# Altium footprint library tianxiaohua_PcbLib.PcbLib: 138 footprints (part 2 of 9)
Each footprint in its own frame and in the unit in brackets; x right, y up, seen from the top. Pads: shape width x height; smd on the part's side, far side on the other; paste and mask are expansions set on the pad; w line width, h text height; cw(c..) or ccw(c..) is an arc to the next point about the centre after c.
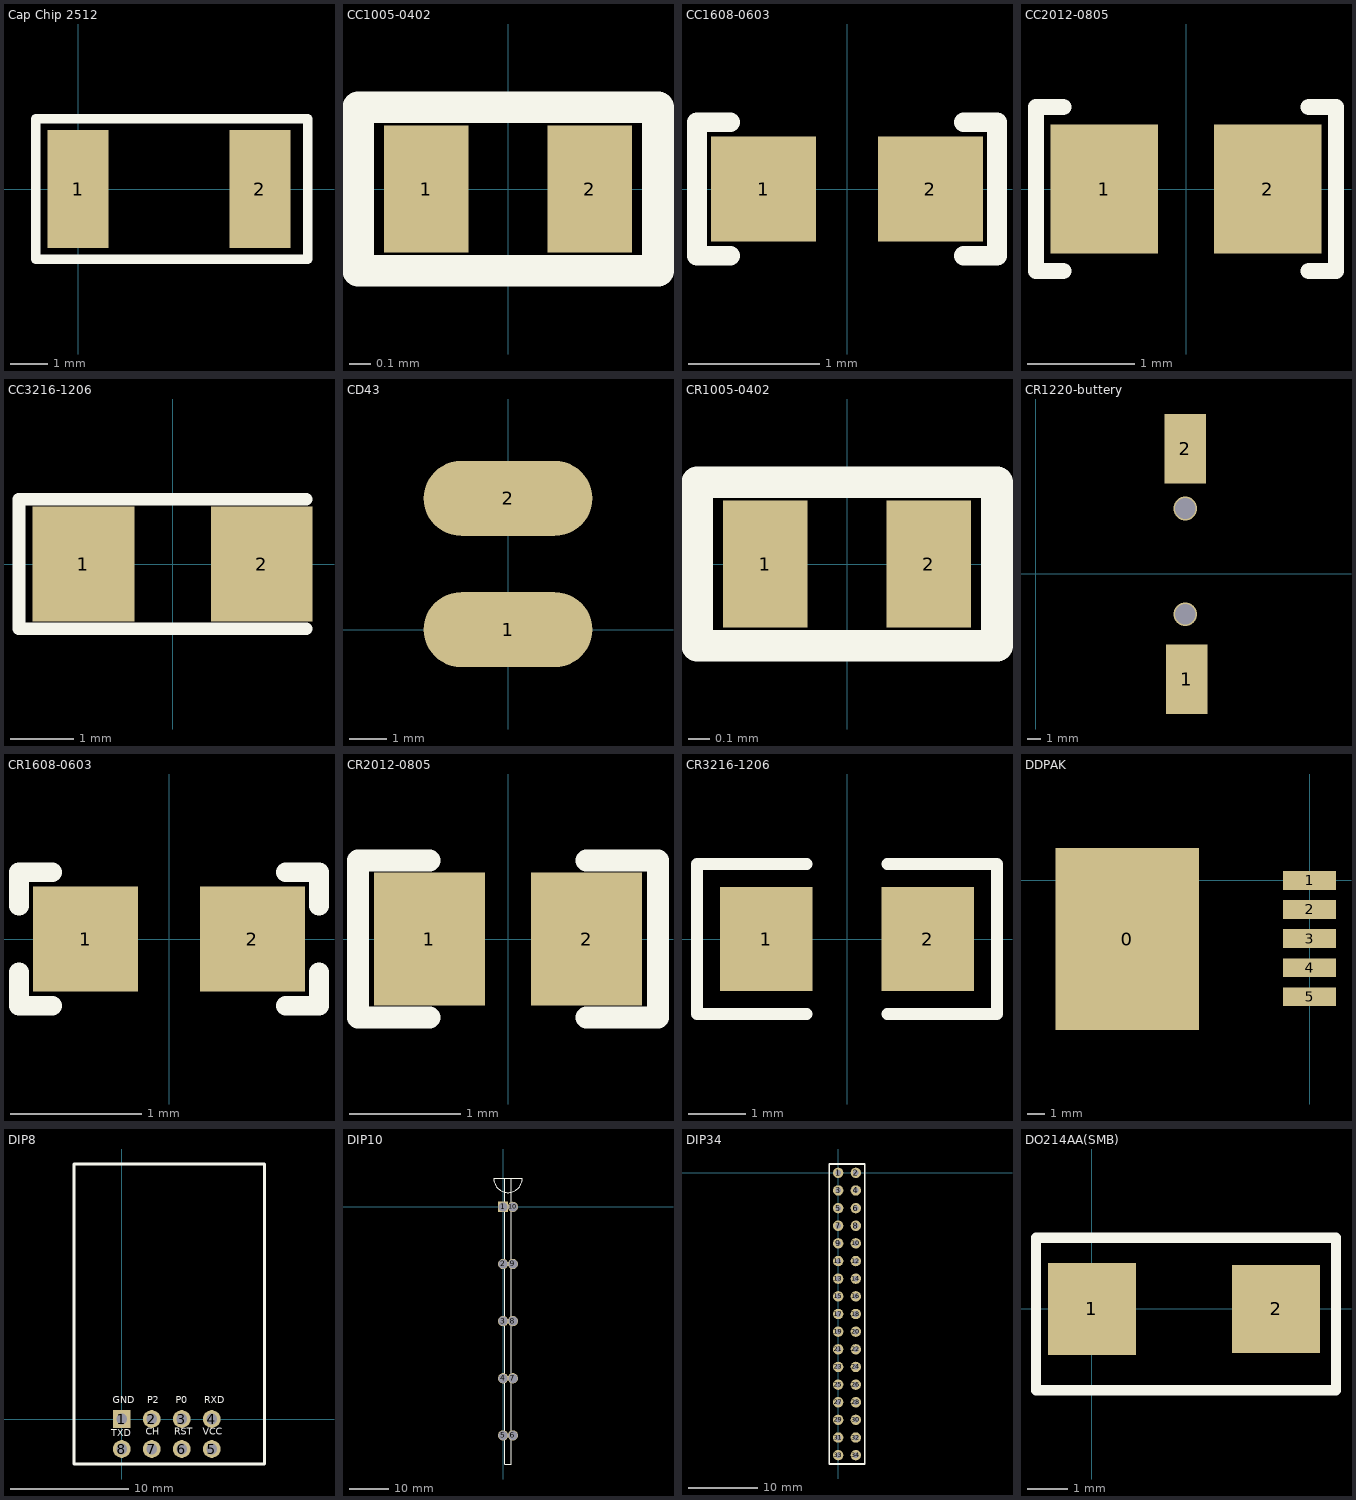
[diagram p1: the footprints below, top view; thin cyan lines are the x and y axes]

## Cap Chip 2512 [mm]
pads (2):
  rect 1.65x3.2 smd: 1(0,0) 2(4.93,0)
Top Overlay:
  lines w0.254: -1.143,-1.905 6.223,-1.905 6.223,1.905 -0.889,1.905 -1.143,1.905 -1.143,-1.905
3D body: height 0.25, standoff 0, extent -0.635,-1.397 5.588,1.397

## CC1005-0402 [mm]
pads (2):
  rect 0.4x0.6 smd: 1(-0.387,0) 2(0.387,0)
Top Overlay:
  lines w0.15: -0.71,-0.387 0.71,-0.387 0.71,0.387 -0.71,0.387 -0.71,-0.387
3D body "CC0402.STEP": height 0.3, standoff 0, extent -0.5,-0.25 0.5,0.25

## CC1608-0603 [mm]
pads (2):
  rect 0.8x0.8 smd: 1(-0.635,0) 2(0.635,0)
Top Overlay:
  lines w0.15: -0.889,-0.508 -1.143,-0.508 -1.143,0.254 -1.143,0.508 -0.889,0.508 ; 0.889,-0.508 1.143,-0.508 1.143,0.254 1.143,0.508 0.889,0.508
3D body "CC0603.STEP": height 0.3, standoff 0, extent -0.8,-0.4 0.8,0.4

## CC2012-0805 [mm]
pads (2):
  rect 1x1.2 smd: 1(-0.762,0) 2(0.762,0)
Top Overlay:
  lines w0.15: -1.143,-0.762 -1.397,-0.762 -1.397,0.762 -1.143,0.762 ; 1.143,-0.762 1.397,-0.762 1.397,0.762 1.143,0.762
3D body "CC0805.STEP": height 0.5, standoff 0, extent -1,-0.625 1,0.625

## CC3216-1206 [mm]
pads (2):
  rect 1.6x1.8 smd: 1(-1.4,0) 2(1.4,0)
Top Overlay:
  lines w0.2: 2.1,-1.016 -2.413,-1.016 -2.413,1.016 2.1,1.016
3D body "CC1206.STEP": height 0.5, standoff 0, extent -1,-0.625 1,0.625

## CD43 [mm]
pads (2):
  oval 4.5x2 smd: 1(0,0) 2(0,3.5)
3D body "User Library-CD43NP.STEP": height 3.5, standoff 0, extent -2.15,-0.622 2.15,4.178

## CR1005-0402 [mm]
pads (2):
  rect 0.4x0.6 smd: 1(-0.387,0) 2(0.387,0)
Top Overlay:
  lines w0.15: -0.71,-0.387 -0.71,0.387 0.71,0.387 0.71,-0.387 -0.71,-0.387
3D body "R0402.STEP": height 0.35, standoff 0, extent -0.5,-0.25 0.5,0.25

## CR1220-buttery [mm]
pads (2):
  rect 3x5 smd: 1(10.922,-7.62) 2(10.787,9.017)
via 10.795,4.699 diameter 1.7 hole 1.5
via 10.795,-2.921 diameter 1.7 hole 1.5
3D body "User Library-Battery Holder for CR1220 SMD.step": height 4.03, standoff -0.72, extent 3.412,-8.765 18.161,10.035
3D body "User Library-CR1220-2.STEP": height 4, standoff 2, extent 4.468,-5.438 16.868,6.962

## CR1608-0603 [mm]
pads (2):
  rect 0.8x0.8 smd: 1(-0.635,0) 2(0.635,0)
Top Overlay:
  lines w0.15: -1.143,-0.254 -1.143,-0.508 -0.889,-0.508 ; -1.143,0.254 -1.143,0.508 -0.889,0.508 ; 0.889,-0.508 1.143,-0.508 1.143,-0.254 ; 0.889,0.508 1.143,0.508 1.143,0.254
3D body "R0603.STEP": height 0.45, standoff 0, extent -0.8,-0.4 0.8,0.4

## CR2012-0805 [mm]
pads (2):
  rect 1x1.2 smd: 1(-0.71,0) 2(0.71,0)
Top Overlay:
  lines w0.2: -0.71,-0.71 -1.355,-0.71 -1.355,0.71 -0.71,0.71 ; 0.71,-0.71 1.355,-0.71 1.355,0.71 0.71,0.71
3D body "R0805.STEP": height 0.55, standoff 0, extent -1,-0.63 1,0.63

## CR3216-1206 [mm]
pads (2):
  rect 1.6x1.8 smd: 1(-1.4,0) 2(1.4,0)
Top Overlay:
  lines w0.2: -0.7,-1.3 -2.6,-1.3 -2.6,1.3 -0.7,1.3 ; 0.7,-1.3 2.6,-1.3 2.6,1.3 0.7,1.3
3D body "R1206.STEP": height 0.6, standoff 0, extent -1.6,-0.8 1.6,0.8

## DDPAK [mm]
pads (6):
  rect 8.38x10.66 smd: 0(-10.668,-3.429)
  rect 3.1x1.1 smd: 1(0,0) 2(0,-1.702) 3(0,-3.404) 4(0,-5.106) 5(0,-6.808)
3D body "User Library-LTC DD-PAK.step": height 4.48, standoff 0, extent -13.335,-8.541 1.016,1.683

## DIP8 [mm]
pads (8):
  rect 1.5x1.5 hole 0.9: 1(0,0)
  round 1.5 hole 0.9: 2(2.54,0) 3(5.08,0) 4(7.62,0) 5(7.62,-2.54) 6(5.08,-2.54) 7(2.54,-2.54) 8(0,-2.54)
Top Overlay:
  lines w0.254: -1.397,-3.81 9.398,-3.81 12.065,-3.81 12.065,21.59 -4.064,21.59 -4.064,-3.81 -1.27,-3.81
  text "RXD" at 6.985,1.143 h1
  text "VCC" at 6.858,-1.524 h1
  text "P0" at 4.572,1.143 h1
  text "RST" at 4.445,-1.524 h1
  text "P2" at 2.159,1.143 h1
  text "CH" at 2.032,-1.524 h1
  text "GND" at -0.762,1.143 h1
  text "TXD" at -0.889,-1.651 h1
3D body: height 11, standoff 0, extent -4.191,-3.81 11.938,3.048
3D body: height 11, standoff 10, extent -4.191,-3.81 11.938,21.463

## DIP10 [mm]
pads (10):
  rect 2.6x2.6 hole 2.3: 1(0,0)
  round 2.6 hole 2.3: 2(0,-14.5) 3(0,-29) 4(0,-43.5) 5(0,-58) 6(2.5,-58) 7(2.5,-43.5) 8(2.5,-29) 9(2.5,-14.5) 10(2.5,0)
Top Overlay:
  lines w0.2: -2.375,7.25 ccw(c1.25,7.25) 4.875,7.25 0.365,7.25 0.365,-65.25 2.135,-65.25 2.135,7.25 -2.375,7.25

## DIP34 [mm]
pads (34):
  round 1.5 hole 0.8: 1(0,0) 2(2.54,0) 3(0,-2.54) 4(2.54,-2.54) 5(0,-5.08) 6(2.54,-5.08) 7(0,-7.62) 8(2.54,-7.62) 9(0,-10.16) 10(2.54,-10.16) 11(0,-12.7) 12(2.54,-12.7) 13(0,-15.24) 14(2.54,-15.24) 15(0,-17.78) 16(2.54,-17.78) 17(0,-20.32) 18(2.54,-20.32) 19(0,-22.86) 20(2.54,-22.86) 21(0,-25.4) 22(2.54,-25.4) 23(0,-27.94) 24(2.54,-27.94) 25(0,-30.48) 26(2.54,-30.48) 27(0,-33.02) 28(2.54,-33.02) 29(0,-35.56) 30(2.54,-35.56) 31(0,-38.1) 32(2.54,-38.1) 33(0,-40.64) 34(2.54,-40.64)
Top Overlay:
  lines w0.254: -1.27,-41.91 -1.27,1.27 3.81,1.27 3.81,-41.91 -1.27,-41.91
3D body: height 1.3, standoff -0.09, extent -1.27,-41.91 3.81,1.27

## DO214AA(SMB) [mm] "稳压管"
pads (2):
  rect 2.2x2.3 smd: 1(0,0)
  rect 2.2x2.2 smd: 2(4.6,0)
Top Overlay:
  lines w0.254: -1.397,-2.032 -1.397,1.778 -1.143,1.778 5.715,1.778 6.096,1.778 6.096,-2.032 -1.397,-2.032
3D body "User Library-DO-214AA SMB.step": height 2.3, standoff 0, extent -0.414,-1.927 4.986,1.673